# Altium footprint library ref-packages-longpad.PCBLIB: 1527 footprints (part 91 of 103)
Each footprint in its own frame and in the unit in brackets; x right, y up, seen from the top. Pads: shape width x height; smd on the part's side, far side on the other; paste and mask are expansions set on the pad; w line width, h text height; cw(c..) or ccw(c..) is an arc to the next point about the centre after c.
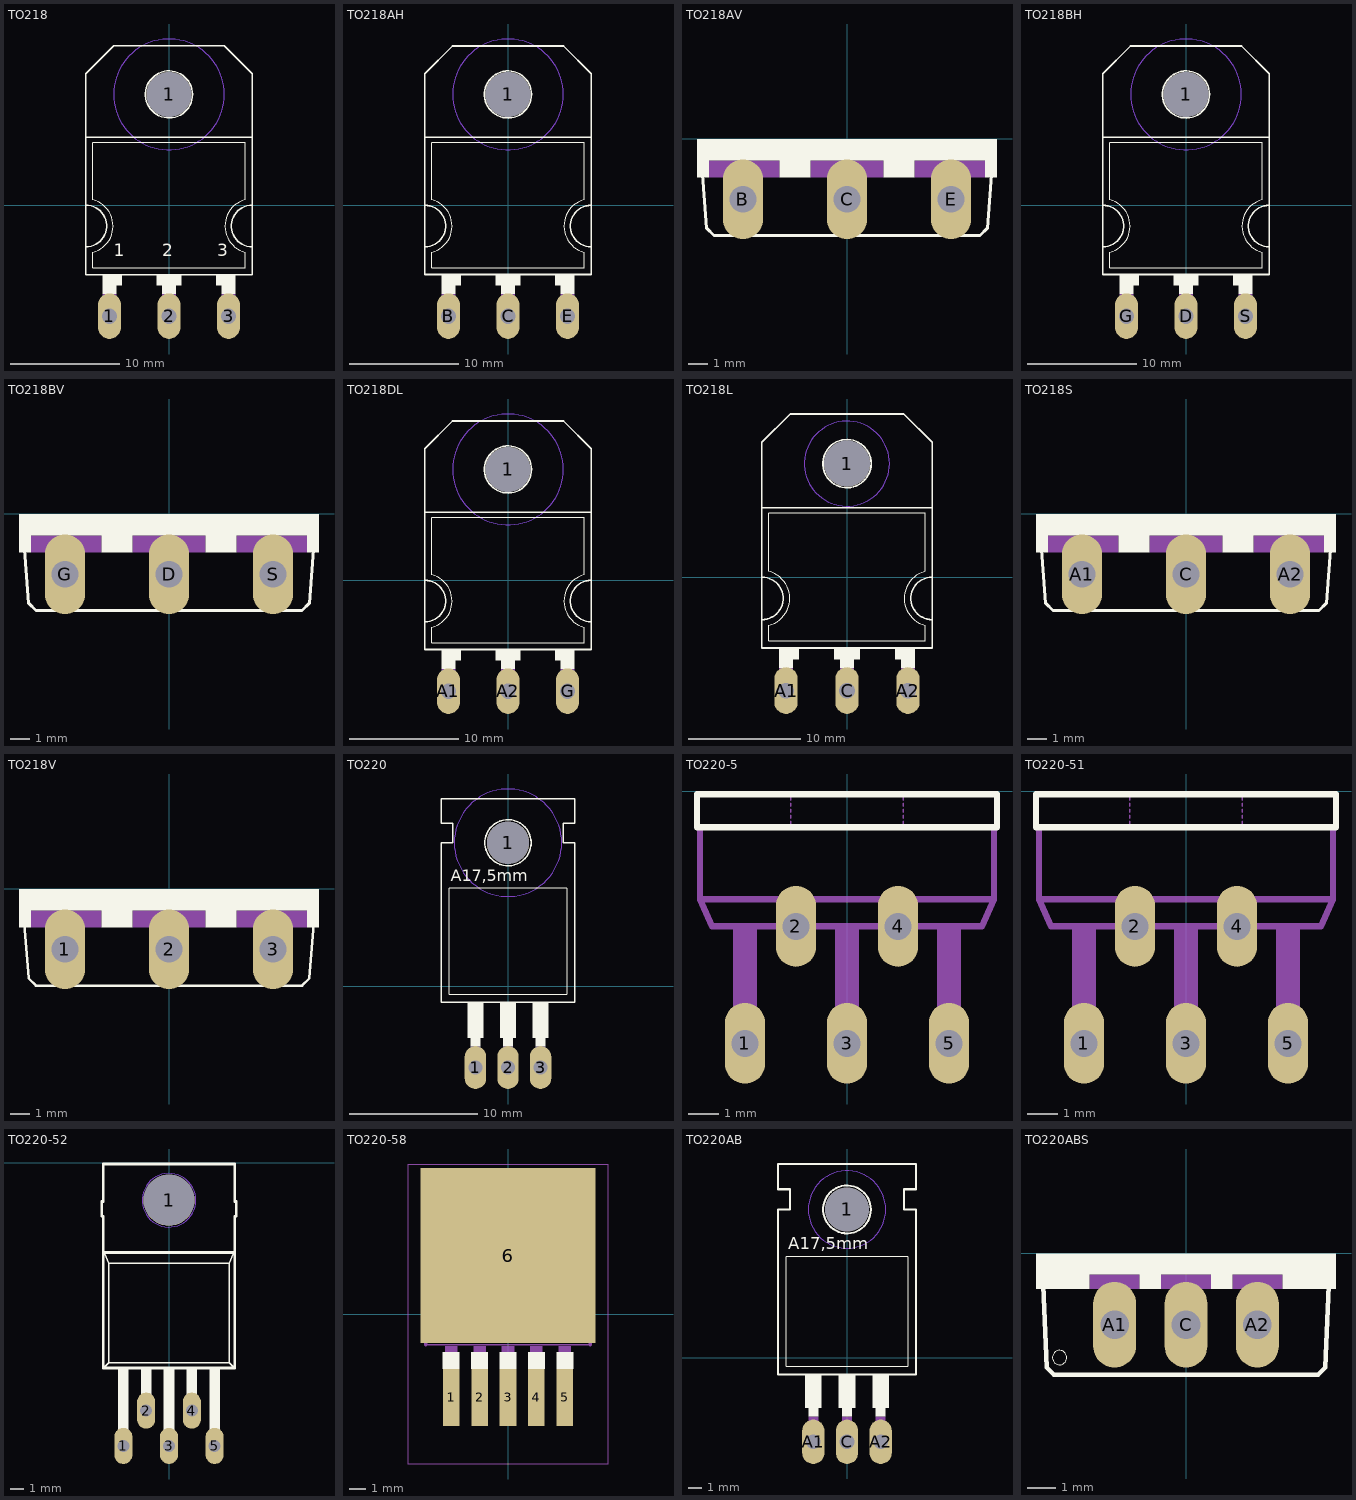
[diagram p90: the footprints below, top view; thin cyan lines are the x and y axes]

## TO218 [mil]
pads (4):
  oval 82.5x165 hole 55: 1(-215,-400) 2(0,-400) 3(215,-400)
  round 162 hole 162: 1(0,400)
Bottom Layer keep-out:
  circle w0: c0,400 r200
Top Overlay:
  circle w5: c0,400 r85
  rectangle: -240,-290 -170,-250
  rectangle: 170,-290 240,-250
  rectangle: -45,-290 45,-250
  rectangle: -240,-320 -190,-250
  rectangle: -25,-320 25,-250
  rectangle: 190,-320 240,-250
  lines w2: 273.71,19.65 ccw(c300,-75) 275,-169.99 275,-225 -275,-225 -275,-170 ccw(c-300,-75) -275,20 -275,225 275,225 275,20
  lines w5: -300,-150 -300,-250 300,-250 300,-150 ; -300,-150 -300,0 ; -300,-150 ccw(c-300,-75) -300,0 ; -300,0 -300,245 ; -300,245 300,245 ; -300,245 -300,475 -200,575 200,575 300,475 300,245 ; 300,-150 300,0 ; 300,-150 cw(c300,-75) 300,0 ; 300,0 300,245
  text "1" at -200,-200 h77.5
  text "2" at -25,-200 h77.5
  text "3" at 175,-200 h77.5
Mechanical 16:
  rectangle: -240,-405 -190,-320
  rectangle: -25,-405 25,-320
  rectangle: 190,-405 240,-320
Via Holes:
  circle w0: c0,400 r200

## TO218AH [mil]
pads (4):
  round 162 hole 162: 1(0,400)
  oval 82.5x165 hole 55: B(-215,-400) C(0,-400) E(215,-400)
Bottom Layer keep-out:
  circle w0: c0,400 r200
Top Overlay:
  circle w6: c0,400 r85
  rectangle: -240,-290 -170,-250
  rectangle: 170,-290 240,-250
  rectangle: -45,-290 45,-250
  rectangle: -240,-320 -190,-250
  rectangle: -25,-320 25,-250
  rectangle: 190,-320 240,-250
  lines w2: 273.71,19.65 ccw(c300,-75) 275,-169.99 275,-225 -275,-225 -275,-170 ccw(c-300,-75) -275,20 -275,225 275,225 275,20
  lines w6: -300,-150 -300,-250 300,-250 300,-150 ; -300,-150 -300,0 ; -300,-150 ccw(c-300,-75) -300,0 ; -300,0 -300,245 ; -300,245 300,245 ; -300,245 -300,475 -200,575 200,575 300,475 300,245 ; 300,-150 300,0 ; 300,-150 cw(c300,-75) 300,0 ; 300,0 300,245
Mechanical 16:
  rectangle: -240,-405 -190,-320
  rectangle: -25,-405 25,-320
  rectangle: 190,-405 240,-320
Via Holes:
  circle w0: c0,400 r200

## TO218AV [mil]
pads (3):
  oval 82.5x165 hole 55: B(-215,-125) C(0,-125) E(215,-125)
Top Overlay:
  rectangle: -310,-45 310,0
  rectangle: -140,-80 -75,-45
  rectangle: 75,-80 140,-45
  rectangle: -310,-80 -285,-45
  rectangle: 285,-80 310,-45
  lines w6: -300,-60 -290,-185 -275,-200 275,-200 290,-185 300,-60
Mechanical 16:
  rectangle: 140,-80 285,-45
  rectangle: -285,-80 -140,-45
  rectangle: -75,-80 75,-45

## TO218BH [mil]
pads (4):
  round 162 hole 162: 1(0,400)
  oval 82.5x165 hole 55: D(0,-400) G(-215,-400) S(215,-400)
Bottom Layer keep-out:
  circle w0: c0,400 r200
Top Overlay:
  circle w6: c0,400 r85
  rectangle: -240,-290 -170,-250
  rectangle: 170,-290 240,-250
  rectangle: -45,-290 45,-250
  rectangle: -240,-320 -190,-250
  rectangle: -25,-320 25,-250
  rectangle: 190,-320 240,-250
  lines w2: 273.71,19.65 ccw(c300,-75) 275,-169.99 275,-225 -275,-225 -275,-170 ccw(c-300,-75) -275,20 -275,225 275,225 275,20
  lines w6: -300,-150 -300,-250 300,-250 300,-150 ; -300,-150 -300,0 ; -300,-150 ccw(c-300,-75) -300,0 ; -300,0 -300,245 ; -300,245 300,245 ; -300,245 -300,475 -200,575 200,575 300,475 300,245 ; 300,-150 300,0 ; 300,-150 cw(c300,-75) 300,0 ; 300,0 300,245
Mechanical 16:
  rectangle: -240,-405 -190,-320
  rectangle: -25,-405 25,-320
  rectangle: 190,-405 240,-320
Via Holes:
  circle w0: c0,400 r200

## TO218BV [mil]
pads (3):
  oval 82.5x165 hole 55: D(0,-125) G(-215,-125) S(215,-125)
Top Overlay:
  rectangle: -310,-45 310,0
  rectangle: -140,-80 -75,-45
  rectangle: 75,-80 140,-45
  rectangle: -310,-80 -285,-45
  rectangle: 285,-80 310,-45
  lines w6: -300,-60 -290,-185 -275,-200 275,-200 290,-185 300,-60
Mechanical 16:
  rectangle: 140,-80 285,-45
  rectangle: -285,-80 -140,-45
  rectangle: -75,-80 75,-45

## TO218DL [mil]
pads (4):
  round 162 hole 162: 1(0,400)
  oval 82.5x165 hole 55: A1(-215,-400) A2(0,-400) G(215,-400)
Bottom Layer keep-out:
  circle w0: c0,400 r200
Top Overlay:
  circle w6: c0,400 r85
  rectangle: -240,-290 -170,-250
  rectangle: 170,-290 240,-250
  rectangle: -45,-290 45,-250
  rectangle: -240,-320 -190,-250
  rectangle: -25,-320 25,-250
  rectangle: 190,-320 240,-250
  lines w2: 273.71,19.65 ccw(c300,-75) 275,-169.99 275,-225 -275,-225 -275,-170 ccw(c-300,-75) -275,20 -275,225 275,225 275,20
  lines w6: -300,-150 -300,-250 300,-250 300,-150 ; -300,-150 -300,0 ; -300,-150 ccw(c-300,-75) -300,0 ; -300,0 -300,245 ; -300,245 300,245 ; -300,245 -300,475 -200,575 200,575 300,475 300,245 ; 300,-150 300,0 ; 300,-150 cw(c300,-75) 300,0 ; 300,0 300,245
Mechanical 16:
  rectangle: -240,-405 -190,-320
  rectangle: -25,-405 25,-320
  rectangle: 190,-405 240,-320
Via Holes:
  circle w0: c0,400 r200

## TO218L [mil]
pads (4):
  round 162 hole 162: 1(0,400)
  oval 82.5x165 hole 55: A1(-215,-400) A2(215,-400) C(0,-400)
Bottom Layer keep-out:
  circle w0: c0,400 r150
Top Overlay:
  circle w6: c0,400 r85
  rectangle: -240,-290 -170,-250
  rectangle: 170,-290 240,-250
  rectangle: -45,-290 45,-250
  rectangle: -240,-320 -190,-250
  rectangle: -25,-320 25,-250
  rectangle: 190,-320 240,-250
  lines w2: 273.71,19.65 ccw(c300,-75) 275,-169.99 275,-225 -275,-225 -275,-170 ccw(c-300,-75) -275,20 -275,225 275,225 275,20
  lines w6: -300,-150 -300,-250 300,-250 300,-150 ; -300,-150 -300,0 ; -300,-150 ccw(c-300,-75) -300,0 ; -300,0 -300,245 ; -300,245 300,245 ; -300,245 -300,475 -200,575 200,575 300,475 300,245 ; 300,-150 300,0 ; 300,-150 cw(c300,-75) 300,0 ; 300,0 300,245
Mechanical 16:
  rectangle: -240,-405 -190,-320
  rectangle: -25,-405 25,-320
  rectangle: 190,-405 240,-320
Via Holes:
  circle w0: c0,400 r150

## TO218S [mil]
pads (3):
  oval 82.5x165 hole 55: A1(-215,-125) A2(215,-125) C(0,-125)
Top Overlay:
  rectangle: -310,-45 310,0
  rectangle: -140,-80 -75,-45
  rectangle: 75,-80 140,-45
  rectangle: -310,-80 -285,-45
  rectangle: 285,-80 310,-45
  lines w6: -300,-60 -290,-185 -275,-200 275,-200 290,-185 300,-60
Mechanical 16:
  rectangle: 140,-80 285,-45
  rectangle: -285,-80 -140,-45
  rectangle: -75,-80 75,-45

## TO218V [mil]
pads (3):
  oval 82.5x165 hole 55: 1(-215,-125) 2(0,-125) 3(215,-125)
Top Overlay:
  rectangle: -310,-45 310,0
  rectangle: -140,-80 -75,-45
  rectangle: 75,-80 140,-45
  rectangle: -310,-80 -285,-45
  rectangle: 285,-80 310,-45
  lines w5: -300,-60 -290,-185 -275,-200 275,-200 290,-185 300,-60
Mechanical 16:
  rectangle: 140,-80 285,-45
  rectangle: -285,-80 -140,-45
  rectangle: -75,-80 75,-45
  text "1" at -240,-175 h77.5
  text "2" at -25,-175 h77.5
  text "3" at 190,-175 h77.5

## TO220 [mil]
pads (4):
  oval 66x132 hole 44: 1(-100,-250) 2(0,-250) 3(100,-250)
  round 130 hole 130: 1(0,440)
Bottom Layer keep-out:
  circle w0: c0,440 r165
Top Overlay:
  circle w5: c0,440 r71
  rectangle: 85,-185 115,-160
  rectangle: -15,-185 15,-160
  rectangle: -115,-185 -85,-160
  rectangle: -125,-160 -75,-50
  rectangle: -25,-160 25,-50
  rectangle: 75,-160 125,-50
  lines w2: -180,-25 180,-25 180,300 -180,300 -180,-25
  lines w5: -205,-50 205,-50 205,440 170,440 170,500 205,500 205,575 -205,575 -205,500 -170,500 -170,440 -205,440 -205,-50
  text "A17,5mm" at -175,310 h60.45
Mechanical 16:
  rectangle: -115,-260 -85,-185
  rectangle: -15,-260 15,-185
  rectangle: 85,-260 115,-185
  text "1" at -125,0 h77.5
  text "2" at -25,0 h77.5
  text "3" at 75,0 h77.5
Via Holes:
  circle w0: c0,440 r165

## TO220-5 [mil]
pads (5):
  oval 53.15x106.29 hole 35.43: 1(-133.86,-330.71) 2(-66.93,-177.17) 3(0,-330.71) 4(66.93,-177.17) 5(133.86,-330.71)
Top Overlay:
  lines w8: -196.85,-47.24 -196.85,-3.94 196.85,-3.94 196.85,-47.24 -196.85,-47.24
Mechanical 16:
  rectangle: -149.61,-338.58 -118.11,-295.28
  rectangle: -15.75,-338.58 15.75,-295.28
  rectangle: 118.11,-338.58 149.61,-295.28
  rectangle: -149.61,-295.28 -118.11,-177.17
  rectangle: -15.75,-295.28 15.75,-177.17
  rectangle: 118.11,-295.28 149.61,-177.17
  rectangle: -82.68,-185.04 -51.18,-177.17
  rectangle: 51.18,-185.04 82.68,-177.17
  lines w2: -73.62,-46.06 -73.62,-39.37 ; -73.62,-35.43 -73.62,-31.5 ; -73.62,-27.56 -73.62,-23.62 ; -73.62,-19.69 -73.62,-15.75 ; -73.62,-11.81 -73.62,-7.87 ; 73.62,-46.06 73.62,-39.37 ; 73.62,-35.43 73.62,-31.5 ; 73.62,-27.56 73.62,-23.62 ; 73.62,-19.69 73.62,-15.75 ; 73.62,-11.81 73.62,-7.87
  lines w8: -192.91,-47.24 -192.91,-141.73 ; 192.91,-47.24 192.91,-141.73 ; -192.91,-141.73 -177.17,-177.17 177.17,-177.17 192.91,-141.73 ; -192.91,-141.73 192.91,-141.73

## TO220-51 [mil]
pads (5):
  oval 53.15x106.29 hole 35.43: 1(-133.86,-330.71) 2(-66.93,-177.17) 3(0,-330.71) 4(66.93,-177.17) 5(133.86,-330.71)
Top Overlay:
  lines w8: -196.85,-47.24 -196.85,-3.94 196.85,-3.94 196.85,-47.24 -196.85,-47.24
Mechanical 16:
  rectangle: -149.61,-338.58 -118.11,-295.28
  rectangle: -15.75,-338.58 15.75,-295.28
  rectangle: 118.11,-338.58 149.61,-295.28
  rectangle: -149.61,-295.28 -118.11,-177.17
  rectangle: -15.75,-295.28 15.75,-177.17
  rectangle: 118.11,-295.28 149.61,-177.17
  rectangle: -82.68,-185.04 -51.18,-177.17
  rectangle: 51.18,-185.04 82.68,-177.17
  lines w2: -73.62,-46.06 -73.62,-39.37 ; -73.62,-35.43 -73.62,-31.5 ; -73.62,-27.56 -73.62,-23.62 ; -73.62,-19.69 -73.62,-15.75 ; -73.62,-11.81 -73.62,-7.87 ; 73.62,-46.06 73.62,-39.37 ; 73.62,-35.43 73.62,-31.5 ; 73.62,-27.56 73.62,-23.62 ; 73.62,-19.69 73.62,-15.75 ; 73.62,-11.81 73.62,-7.87
  lines w8: -192.91,-47.24 -192.91,-141.73 ; 192.91,-47.24 192.91,-141.73 ; -192.91,-141.73 -177.17,-177.17 177.17,-177.17 192.91,-141.73 ; -192.91,-141.73 192.91,-141.73

## TO220-52 [mil]
pads (6):
  oval 53.15x106.29 hole 35.43: 1(-133.86,-830.71) 2(-66.93,-727.17) 3(0,-830.71) 4(66.93,-727.17) 5(133.86,-830.71)
  round 149.61 hole 149.61: 1(0,-110.24)
Top Layer keep-out:
  circle w0: c0,-110.24 r78.74
Bottom Layer keep-out:
  circle w0: c0,-110.24 r78.74
Top Overlay:
  rectangle: -149.61,-791.34 -118.11,-602.36
  rectangle: -82.68,-688.98 -51.18,-602.36
  rectangle: -15.75,-791.34 15.75,-602.36
  rectangle: 51.18,-688.98 82.68,-602.36
  rectangle: 118.11,-791.34 149.61,-602.36
  lines w4: -192.91,-602.36 -177.17,-586.61 ; -188.98,-267.72 -177.17,-295.28 ; 188.98,-267.72 177.17,-295.28 ; 192.91,-602.36 177.17,-586.61 ; -177.17,-586.61 177.17,-586.61 ; -177.17,-586.61 -177.17,-295.28 ; -177.17,-295.28 177.17,-295.28 ; 177.17,-586.61 177.17,-295.28
  lines w8: -196.85,-157.48 -196.85,-114.17 ; -192.91,-157.48 -192.91,-263.78 ; -192.91,-114.17 -192.91,-3.94 192.91,-3.94 192.91,-114.17 ; 192.91,-157.48 192.91,-263.78 ; 196.85,-157.48 196.85,-114.17 ; -192.91,-263.78 -192.91,-602.36 192.91,-602.36 192.91,-263.78 ; -192.91,-263.78 192.91,-263.78
Mechanical 16:
  rectangle: -149.61,-838.58 -118.11,-791.34
  rectangle: -82.68,-736.22 -51.18,-688.98
  rectangle: -15.75,-838.58 15.75,-791.34
  rectangle: 51.18,-736.22 82.68,-688.98
  rectangle: 118.11,-838.58 149.61,-791.34
Via Holes:
  circle w0: c0,-110.24 r106.3

## TO220-58 [mm]
pads (6):
  rect 1x3.4 smd: 1(-3.4,-5) 2(-1.7,-5) 3(0,-5) 4(1.7,-5) 5(3.4,-5)
  rect 10.5x10.5 smd: 6(0,3.5)
Top Overlay:
  rectangle: -0.508,-3.302 0.508,-2.286
  rectangle: -3.908,-3.302 -2.892,-2.286
  rectangle: -2.208,-3.302 -1.192,-2.286
  rectangle: 1.192,-3.302 2.208,-2.286
  rectangle: 2.892,-3.302 3.908,-2.286
Mechanical 16:
  circle w0.102: c0,0.46 r1
  rectangle: -0.381,-5.461 0.381,-1.905
  rectangle: -3.781,-5.461 -3.019,-1.905
  rectangle: -2.081,-5.461 -1.319,-1.905
  rectangle: 1.319,-5.461 2.081,-1.905
  rectangle: 3.019,-5.461 3.781,-1.905
  region: 0,0 0.254,0 0.254,0.254 0,0.254
  lines w0.102: -4.917,-1.839 4.917,-1.839 ; -4.9,7.1 -4.5,6.2 ; -4.8,-1.7 -4.5,-1.4 ; 4.8,-1.7 4.5,-1.4 ; 4.9,7.1 4.5,6.2 ; -4.5,-1.4 4.5,-1.4 ; -4.5,-1.4 -4.5,6.2 ; -4.5,6.2 4.5,6.2 ; 4.5,-1.4 4.5,6.2
  lines w0.203: -4.917,-1.839 -4.917,7.165 4.917,7.165 4.917,-1.839
Mechanical 27:
  lines w0.051: -5.973,-8.983 5.973,-8.983 5.973,8.983 -5.973,8.983 -5.973,-8.983

## TO220AB [mil]
pads (4):
  round 130 hole 130: 1(0,440)
  oval 66x132 hole 44: A1(-100,-250) A2(100,-250) C(0,-250)
Bottom Layer keep-out:
  circle w0: c0,440 r115
Top Overlay:
  circle w6: c0,440 r71
  rectangle: 85,-175 115,-150
  rectangle: -15,-175 15,-150
  rectangle: -115,-175 -85,-150
  rectangle: -125,-150 -75,-50
  rectangle: -25,-150 25,-50
  rectangle: 75,-150 125,-50
  lines w2: -180,-25 180,-25 180,300 -180,300 -180,-25
  lines w6: -205,-50 205,-50 205,440 170,440 170,500 205,500 205,575 -205,575 -205,500 -170,500 -170,440 -205,440 -205,-50
  text "A17,5mm" at -175,310 h60.45
Mechanical 16:
  rectangle: 85,-250 115,-175
  rectangle: -15,-250 15,-175
  rectangle: -115,-250 -85,-175
Via Holes:
  circle w0: c0,440 r115

## TO220ABS [mil]
pads (3):
  oval 60x120 hole 40: A1(-100,-100) A2(100,-100) C(0,-100)
Top Overlay:
  circle w0: c-177,-146 r10
  rectangle: -210,-30 210,0
  rectangle: -210,-50 -135,-30
  rectangle: -65,-50 -35,-30
  rectangle: 35,-50 65,-30
  rectangle: 135,-50 210,-30
  lines w6: -200,-45 -195,-160 -185,-170 185,-170 195,-160 200,-45
Mechanical 16:
  rectangle: -135,-50 -65,-30
  rectangle: -35,-50 35,-30
  rectangle: 65,-50 135,-30